# Altium footprint library CDPcomponents.PcbLib: 40 footprints (part 1 of 3)
Each footprint in its own frame and in the unit in brackets; x right, y up, seen from the top. Pads: shape width x height; smd on the part's side, far side on the other; paste and mask are expansions set on the pad; w line width, h text height; cw(c..) or ccw(c..) is an arc to the next point about the centre after c.
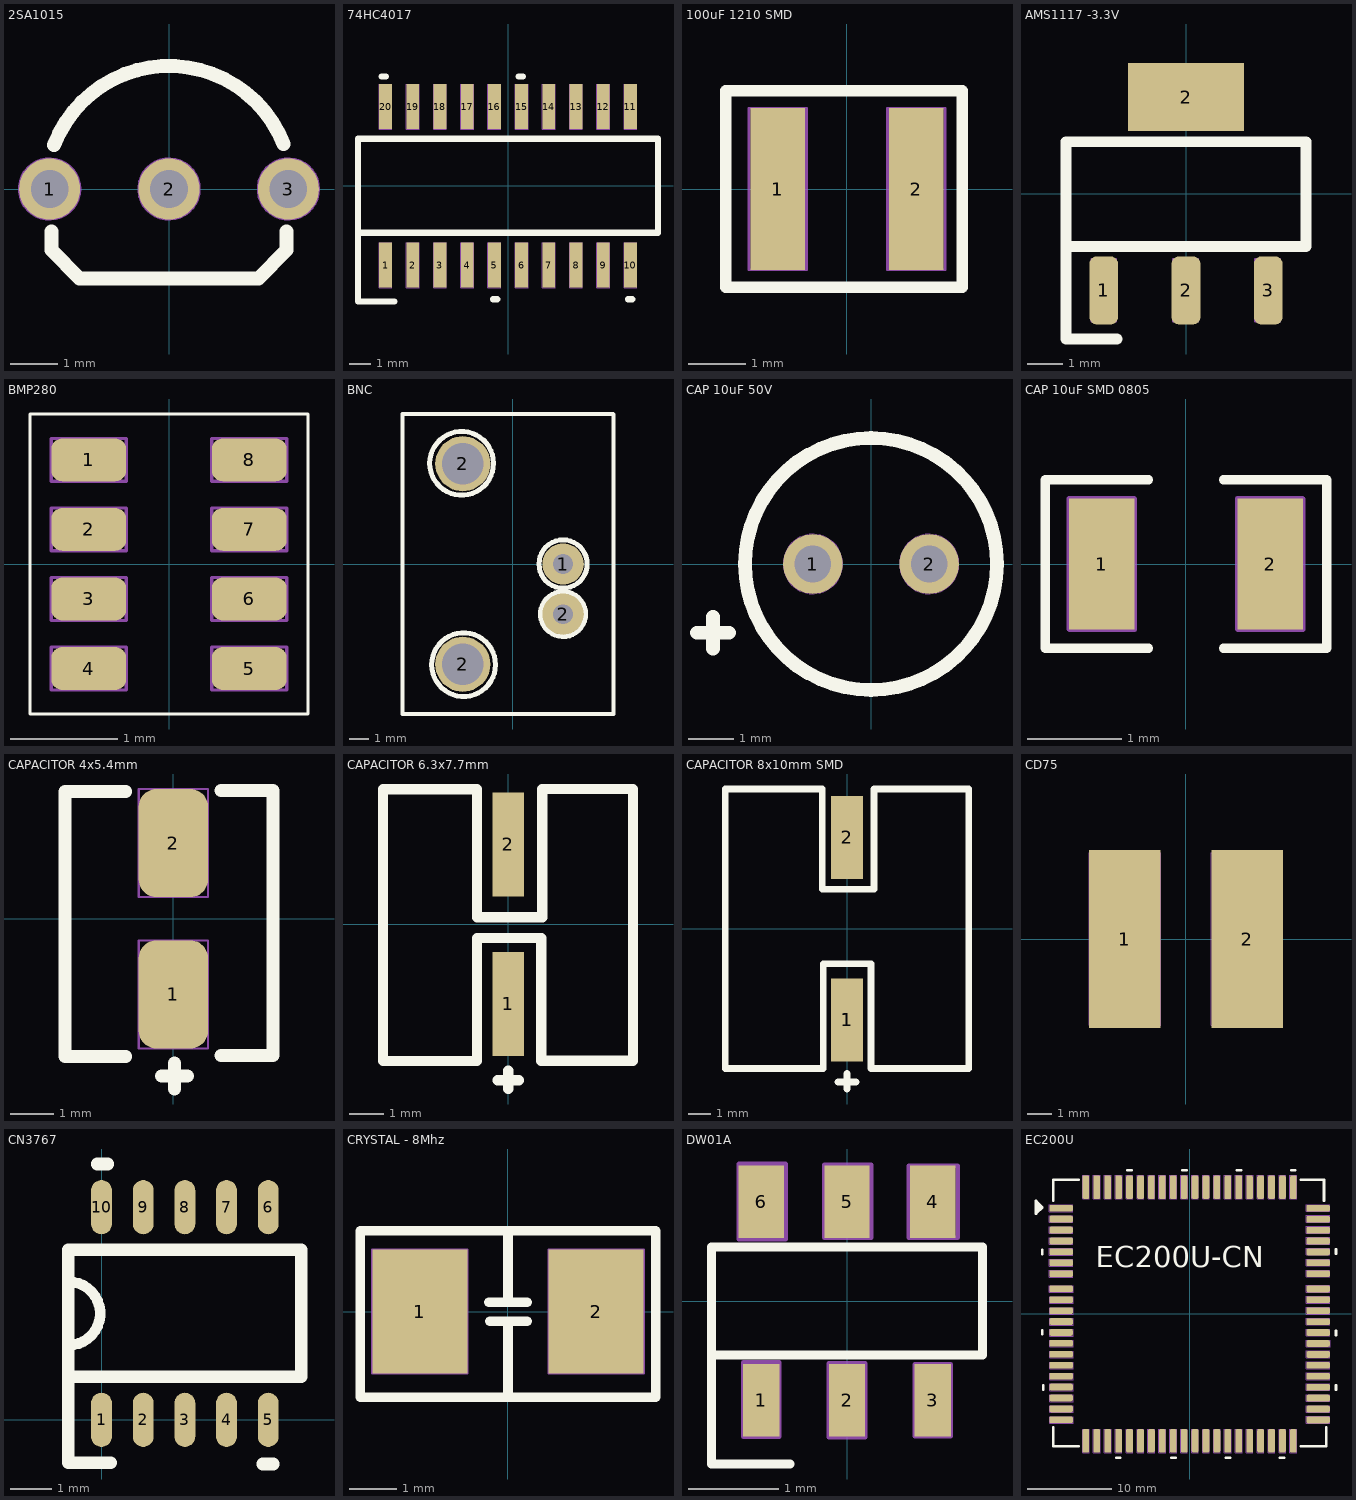
[diagram p0: the footprints below, top view; thin cyan lines are the x and y axes]

## 2SA1015 [mm] "2SA1015 (TO-92)"
height 4.8
pads (3):
  round 1.3 hole 0.8 mask+0.1: 1(-2.54,0) 2(0,0) 3(2.54,0)
Top Overlay:
  lines w0.3: -2.445,0.935 cw(c0,0) 2.437,0.954 ; 2.5,-0.9 2.5,-1.3 1.9,-1.9 -1.9,-1.9 -2.5,-1.3 -2.5,-0.9 ; -2.5,-0.9 -2.5,-0.9
Mechanical 1:
  circle w0.05: c-2.54,0 r0.65
  circle w0.05: c2.54,0 r0.65
  circle w0.05: c-2.54,0 r0.65
  circle w0.05: c0,0 r0.65
  lines w0.05: -2.5,-0.8 -2.5,-1.3 -1.9,-1.9 -1.275,-1.9 -0.025,-1.9 1.8,-1.9 2.5,-1.2 2.5,-0.8 ; -2.467,0.897 cw(c0,0) 2.48,0.859
3D body "User Library-TO-92_SS127.STEP": height 8.85, standoff -4.42, extent -4.227,-1.4 3.4,2.47

## 74HC4017 [mm] "74HC4017 (SO16-SOT109-1)"
height 1.45
pads (20):
  rect 0.6x2.1 smd mask+0.1: 1(-5.715,-3.7) 2(-4.445,-3.7) 3(-3.175,-3.7) 4(-1.905,-3.7) 5(-0.635,-3.7) 6(0.635,-3.7) 7(1.905,-3.7) 8(3.175,-3.7) 9(4.445,-3.7) 10(5.715,-3.7) 11(5.715,3.7) 12(4.445,3.7) 13(3.175,3.7) 14(1.905,3.7) 15(0.635,3.7) 16(-0.635,3.7) 17(-1.905,3.7) 18(-3.175,3.7) 19(-4.445,3.7) 20(-5.715,3.7)
Top Overlay:
  lines w0.3: -5.9,5.1 -5.7,5.1 ; -5.3,-5.4 -7,-5.4 -7,-2.2 ; -0.7,-5.3 -0.5,-5.3 ; 0.5,5.1 0.7,5.1 ; 5.6,-5.3 5.8,-5.3 ; -7,-2.2 7,-2.2 7,2.2 -0.45,2.2 -7,2.2 -7,-2.2
Mechanical 1:
  lines w0.05: -7,-2.2 7,-2.2 7,2.2 0.45,2.2 -7,2.2 -7,-1.665 -7,-2.2 ; -6.015,-4.75 -5.415,-4.75 -5.415,-2.65 -6.015,-2.65 -6.015,-4.75 ; -6.015,2.65 -6.015,4.75 -5.415,4.75 -5.415,2.65 -6.015,2.65 ; -4.745,-4.75 -4.745,-2.65 -4.145,-2.65 -4.145,-4.75 -4.745,-4.75 ; -4.745,2.65 -4.745,4.75 -4.145,4.75 -4.145,2.65 -4.745,2.65 ; -3.475,-4.75 -3.475,-2.65 -2.875,-2.65 -2.875,-4.75 -3.475,-4.75 ; -3.475,2.65 -3.475,4.75 -2.875,4.75 -2.875,2.65 -3.475,2.65 ; -2.205,-4.75 -2.205,-2.65 -1.605,-2.65 -1.605,-4.75 -2.205,-4.75 ; -2.205,2.65 -2.205,4.75 -1.605,4.75 -1.605,2.65 -2.205,2.65 ; -0.935,-4.75 -0.935,-2.65 -0.335,-2.65 -0.335,-4.75 -0.935,-4.75 ; -0.935,2.65 -0.935,4.75 -0.335,4.75 -0.335,2.65 -0.935,2.65 ; 0.335,-4.75 0.335,-2.65 0.935,-2.65 0.935,-4.75 0.335,-4.75 ; 0.335,2.65 0.335,4.75 0.935,4.75 0.935,2.65 0.335,2.65 ; 1.605,-4.75 1.605,-2.65 2.205,-2.65 2.205,-4.75 1.605,-4.75 ; 1.605,2.65 1.605,4.75 2.205,4.75 2.205,2.65 1.605,2.65 ; 2.875,-4.75 2.875,-2.65 3.475,-2.65 3.475,-4.75 2.875,-4.75 ; 2.875,2.65 2.875,4.75 3.475,4.75 3.475,2.65 2.875,2.65 ; 4.145,-4.75 4.145,-2.65 4.745,-2.65 4.745,-4.75 4.145,-4.75 ; 4.145,2.65 4.145,4.75 4.745,4.75 4.745,2.65 4.145,2.65 ; 5.415,-4.75 5.415,-2.65 6.015,-2.65 6.015,-4.75 5.415,-4.75 ; 5.415,2.65 5.415,4.75 6.015,4.75 6.015,2.65 5.415,2.65

## 100uF 1210 SMD [mm]
pads (2):
  rect 0.95x2.8 smd: 1(-1.2,0) 2(1.2,0)
Top Overlay:
  lines w0.2: -2.1,-1.7 -2.1,1.7 -1.9,1.7 -0.1,1.7 2,1.7 2,1.2 2,0 2,-1.7 -2.1,-1.7
Mechanical 1:
  lines w0.05: -1.7,-1.4 -1.7,1.4 -0.7,1.4 -0.7,-1.4 -1.7,-1.4 ; 0.7,-1.4 1.7,-1.4 1.7,1.4 0.7,1.4 0.7,-1.4
3D body "GRM32EC80G107KE20L.stp": height 2.7, standoff 0, extent -1.6,-1.25 1.6,1.25

## AMS1117 -3.3V [mm]
pads (4):
  rrect50% 0.8x1.9 smd: 1(-2.3,-2.7) 2(0,-2.7) 3(2.3,-2.7)
  rect 3.25x1.9 smd: 2(0,2.7)
Top Overlay:
  lines w0.3: -3.355,-1.5 -3.355,-4.055 -3.353,-4.057 -1.929,-4.057 ; -3.355,-1.472 3.355,-1.472 3.355,1.452 -0.398,1.452 -3.355,1.452 -3.355,-1.472
Mechanical 1:
  lines w0.05: -2.475,-1.825 -1.95,-1.825 -1.95,-3.575 -2.65,-3.575 -2.65,-1.825 -2.3,-1.825 ; -0.185,-1.825 0.34,-1.825 0.34,-3.575 -0.36,-3.575 -0.36,-1.825 -0.01,-1.825 ; 0,3.542 1.4,3.542 1.4,1.832 -1.4,1.832 -1.4,3.543 0.35,3.543 ; 2.105,-1.825 2.63,-1.825 2.63,-3.575 1.93,-3.575 1.93,-1.825 2.28,-1.825
3D body "AMS1117-3.3.stp": height 1.8, standoff 0, extent -3.252,-3.5 3.253,3.5

## BMP280 [mm]
pads (8):
  rrect50% 0.7x0.4 smd: 1(-0.75,0.975) 2(-0.75,0.325) 3(-0.75,-0.325) 4(-0.75,-0.975) 5(0.75,-0.975) 6(0.75,-0.325) 7(0.75,0.325) 8(0.75,0.975)
Top Overlay:
  lines w0.03: -1.3,-1.4 1.3,-1.4 1.3,1.3 1.3,1.404 -1.3,1.404 -1.3,1.3 -1.3,-1.4
Mechanical 1:
  lines w0.03: 0.4,-1.175 0.4,-0.775 ; 0.4,-1.175 1.1,-1.175 ; 0.4,-1.175 0.4,-0.775 ; 0.4,-1.175 1.1,-1.175 ; 0.4,-0.775 1.1,-0.775 ; 0.4,-0.775 1.1,-0.775 ; 1.1,-1.175 1.1,-0.775 ; 1.1,-1.175 1.1,-0.775 ; -1.1,-1.175 -0.4,-1.175 -0.4,-0.775 -1.1,-0.775 -1.1,-1.175 ; -1.1,-0.525 -0.4,-0.525 -0.4,-0.125 -1.1,-0.125 -1.1,-0.525 ; -1.1,0.125 -0.4,0.125 -0.4,0.525 -1.1,0.525 -1.1,0.125 ; -1.1,0.775 -0.4,0.775 -0.4,1.175 -1.1,1.175 -1.1,0.775 ; 0.4,-0.525 0.4,-0.125 1.1,-0.125 1.1,-0.525 0.4,-0.525 ; 0.4,0.125 0.4,0.525 1.1,0.525 1.1,0.125 0.4,0.125 ; 0.4,0.775 0.4,1.175 1.1,1.175 1.1,0.775 0.4,0.775
3D body "bmp280.stp": height 1, standoff 0, extent -1,-1.25 1,1.25

## BNC [mm]
pads (4):
  round 2.1 hole 1: 1(2.54,0) 2(2.54,-2.54)
  round 2.8 hole 2.1: 2(-2.54,-5.08) 2(-2.54,5.08)
Top Overlay:
  circle w0.254: c-2.6,5.1 r1.616
  circle w0.254: c-2.5,-5.1 r1.616
  circle w0.254: c2.54,-2.54 r1.14
  circle w0.254: c2.54,0 r1.221
  lines w0.2: -5.6,-7.6 5.1,-7.6 5.1,7.571 5.071,7.6 4.5,7.6 -5.6,7.6 -5.6,-7.6
3D body "CP-BNCPC-010.stp": height 15.9, standoff -5, extent -30.625,-7.325 4.785,7.325

## CAP 10uF 50V [mm] "Aluminum 10uF 50V"
height 13
pads (2):
  round 1.3 hole 0.8 mask+0.1: 1(-1.27,0) 2(1.27,0)
Top Overlay:
  circle w0.3: c0,0 r2.75
  lines w0.3: -3.8,-1.5 -3.1,-1.5 ; -3.45,-1.85 -3.45,-1.15
Mechanical 1:
  circle w0.05: c0,0 r2.75
  circle w0.01: c-1.27,0 r0.65
  circle w0.01: c1.27,0 r0.65
3D body "User Library-Capacitor 10uF 50V 7x5mm.STEP": height 7.74, standoff -2.32, extent -2.6,-2.31 2.43,2.7

## CAP 10uF SMD 0805 [mm]
pads (2):
  rect 0.7x1.4 smd: 1(-0.9,0) 2(0.9,0)
Top Overlay:
  lines w0.1: -0.4,-0.9 -1.5,-0.9 -1.5,0.9 -0.4,0.9 ; 0.4,-0.9 1.5,-0.9 1.5,0.9 0.4,0.9
Mechanical 1:
  lines w0.05: -0.551,0.699 -0.552,0.7 ; 0.551,-0.699 0.552,-0.7 ; -0.552,0.7 -0.6,0.7 -1.247,0.7 -1.248,0.698 -1.248,-0.697 -1.243,-0.702 -0.55,-0.702 -0.547,-0.699 -0.547,0.695 -0.552,0.7 ; 0.552,-0.7 0.6,-0.7 1.247,-0.7 1.248,-0.698 1.248,0.697 1.243,0.702 0.55,0.702 0.547,0.699 0.547,-0.695 0.552,-0.7
3D body "0805Y0160561FFR.stp": height 1.3, standoff 0, extent -1,-0.625 1,0.625

## CAPACITOR 4x5.4mm [mm]
pads (2):
  rrect50% 1.6x2.5 smd: 1(0,-1.75) 2(0,1.75)
Top Overlay:
  lines w0.3: -1.1,-3.189 -2.5,-3.189 -2.5,2.945 -1.1,2.945 ; -0.273,-3.637 0.327,-3.637 ; 0.027,-3.937 0.027,-3.337 ; 1.1,-3.164 2.3,-3.164 2.3,2.968 1.1,2.968
Mechanical 1:
  lines w0.05: -0.8,-3 -0.8,-0.5 0.8,-0.5 0.8,-3 -0.8,-3 ; -0.8,0.5 0.8,0.5 0.8,3 -0.8,3 -0.8,0.5
3D body "EEEFP1E100AR.stp": height 5.8, standoff 0, extent -2.25,-2.5 2.05,2.5

## CAPACITOR 6.3x7.7mm [mm]
pads (2):
  rect 0.9x3 smd: 1(0,-2.3) 2(0,2.3)
Top Overlay:
  lines w0.3: -0.3,-4.5 0.3,-4.5 ; 0,-4.755 0,-4.233 ; 0,-4.5 0,-4.3 ; -3.612,-3.948 -0.9,-3.948 -0.9,-0.5 -0.9,-0.399 -0.899,-0.4 0.957,-0.4 0.957,-3.945 3.6,-3.945 3.6,3.9 0.978,3.9 0.978,0.2 -0.9,0.2 -0.9,3.898 -3.612,3.898 -3.612,-3.948
3D body "User Library-User Library-CAP_Al_SMD_6_3x7_7mm.STEP": height 7.7, standoff 0, extent -3.3,-3.65 3.3,3.65

## CAPACITOR 8x10mm SMD [mm]
pads (3):
  rect 1.4x3.7 smd: 1(0,-4.05) 1(0,-4.05) 2(0,4.05)
Top Overlay:
  lines w0.3: -0.4,-6.8 0.4,-6.8 ; 0,-7.113 0,-6.428 ; 0,-6.8 0,-6.6 ; -5.4,-6.2 -5.4,6.2 -1.1,6.2 -1.1,1.75 1.2,1.75 1.2,6.2 5.4,6.2 5.4,-6.2 1.071,-6.2 1.071,-1.55 -1.054,-1.55 -1.054,-2.402 -1.053,-2.403 -1.053,-6.2 -5.4,-6.2
3D body "EEE1EA331AP.stp": height 10.3, standoff 0.1, extent -5.15,-5.85 5.15,5.85

## CD75 [mm]
pads (2):
  rect 2.9x7.2 smd: 1(-2.475,0) 2(2.475,0)
Mechanical 1:
  lines w0.05: -3.925,-3.5 -3.925,3.5 -1.025,3.5 -1.025,-3.5 -3.925,-3.5 ; 1.025,-3.5 3.925,-3.5 3.925,3.5 1.025,3.5 1.025,-3.5
3D body "User Library-cd75.STEP": height 5.09, standoff 0, extent -3.834,-3.5 3.834,3.5

## CN3767 [mm]
pads (10):
  oval 0.5x1.3 smd: 1(0,0) 2(1,0) 3(2,0) 4(3,0) 5(4,0) 6(4,5.1) 7(3,5.1) 8(2,5.1) 9(1,5.1) 10(0,5.1)
Top Overlay:
  lines w0.254: -0.794,1.788 ccw(c-0.794,2.55) -0.794,3.312
  lines w0.3: -0.54,1.026 -0.794,1.026 ; -0.105,6.136 0.149,6.136 ; 0.222,-1.027 -0.794,-1.027 -0.794,1.026 ; 3.867,-1.061 4.121,-1.061 ; -0.794,1.026 4.794,1.026 4.794,4.074 -0.794,4.074 -0.794,1.026
3D body "CN3767.stp": height 1.75, standoff 0, extent -0.45,-0.45 4.45,5.55

## CRYSTAL - 8Mhz [mm]
pads (2):
  rect 2x2.6 smd: 1(-1.85,0) 2(1.85,0)
Top Overlay:
  lines w0.2: -0.4,0.2 0.4,0.2 ; -0.382,-0.199 0.003,-0.199 0,-0.2 ; 0,-1.8 0,-0.2 ; 0,0.3 0,1.6 ; 0.4,-0.2 0,-0.2 ; -3.1,-1.8 3.1,-1.8 3.1,1.7 -2.7,1.7 -3.1,1.7 -3.1,-1.8
Mechanical 1:
  lines w0.05: -2.85,-1.3 -0.85,-1.3 -0.85,1.3 -2.85,1.3 -2.85,-1.3 ; 0.85,-1.3 0.85,1.3 2.85,1.3 2.85,-1.3 0.85,-1.3
3D body "User Library-5032_2.STEP": height 1.2, standoff -0.01, extent -2.609,-1.626 2.391,1.574

## DW01A [mm]
pads (6):
  rect 0.4x0.8 smd: 1(-0.95,-1.1) 2(0,-1.1) 3(0.95,-1.1)
  rect 0.5x0.8 smd: 4(0.95,1.1) 5(0,1.1) 6(-0.95,1.1)
Top Overlay:
  lines w0.1: -0.629,-1.804 -1.498,-1.804 -1.5,-1.805 -1.5,-0.6 ; -1.5,-0.6 -1.5,0.6 -0.6,0.6 1.5,0.6 1.5,-0.6 -1.5,-0.6
Mechanical 1:
  lines w0.05: -1.2,0.686 -1.2,1.518 -0.68,1.518 -0.68,0.686 -1.2,0.686 ; -1.15,-1.501 -0.75,-1.501 -0.75,-0.678 -1.15,-0.678 -1.15,-1.501 ; -0.253,0.7 -0.253,1.51 0.269,1.51 0.269,0.7 -0.253,0.7 ; -0.2,-1.508 0.2,-1.508 0.2,-0.688 -0.2,-0.688 -0.2,-1.508 ; 0.684,0.7 1.225,0.7 1.225,1.5 0.684,1.5 0.684,0.7 ; 0.75,-1.498 0.75,-0.7 1.15,-0.7 1.15,-1.498 0.75,-1.498
3D body "DW01A-G.stp": height 1.35, standoff 0, extent -1.425,-1.4 1.425,1.4

## EC200U [mm] "EC200U - Quectel"
pads (80):
  rrect50% 2.8x0.8 smd: 1(-15.299,12.6) 2(-15.299,11.3) 3(-15.299,10) 4(-15.299,8.7) 5(-15.299,7.4) 6(-15.299,6.1) 7(-15.299,4.8) 8(-15.299,0.4) 9(-15.299,-0.9) 10(-15.299,-2.2) 11(-15.299,-3.5) 12(-15.299,-4.8) 13(-15.299,-6.1) 14(-15.299,-7.4) 15(-15.299,-8.7) 16(-15.299,-10) 17(-15.299,-11.3) 18(-15.299,-12.6) 37(15.299,-12.614) 38(15.299,-11.314) 39(15.299,-10.014) 40(15.299,-8.714) 41(15.299,-7.414) 42(15.299,-6.114) 43(15.299,-4.814) 44(15.299,-3.514) 45(15.299,-2.214) 46(15.299,-0.914) 47(15.299,0.386) 48(15.299,4.786) 49(15.299,6.086) 50(15.299,7.386) 51(15.299,8.686) 52(15.299,9.986) 53(15.299,11.286) 54(15.299,12.586) 141(-15.299,3) 142(-15.299,1.7) 144(15.299,2.986) 145(15.299,1.686)
  rrect50% 0.8x2.8 smd: 19(-9.749,-15.1) 20(-8.449,-15.1) 21(-7.149,-15.1) 22(-5.849,-15.1) 23(-4.549,-15.1) 24(-3.249,-15.1) 25(-1.949,-15.1) 26(-0.649,-15.1) 27(0.651,-15.1) 28(1.951,-15.1) 29(3.251,-15.1) 30(4.551,-15.1) 31(5.851,-15.1) 32(7.151,-15.1) 33(8.451,-15.1) 34(9.751,-15.1) 35(11.051,-15.1) 36(12.351,-15.1) 55(12.349,15.087) 56(11.049,15.087) 57(9.749,15.087) 58(8.449,15.087) 59(7.149,15.087) 60(5.849,15.087) 61(4.549,15.087) 62(3.249,15.087) 63(1.949,15.087) 64(0.649,15.087) 65(-0.651,15.087) 66(-1.951,15.087) 67(-3.251,15.087) 68(-4.551,15.087) 69(-5.851,15.087) 70(-7.151,15.087) 71(-8.451,15.087) 72(-9.753,15.088) 113(-11.053,15.088) 114(-12.349,15.1) 116(-12.349,-15.1) 117(-11.049,-15.1)
Top Overlay:
  lines w0.3: -18.288,12.192 -18.288,12.236 -18.274,12.236 -17.82,12.689 ; -18.288,12.7 -17.526,12.7 ; -18.034,12.827 -18.034,13.208 -17.526,12.7 ; -17.526,-2.421 -17.526,-1.913 ; -17.526,7.112 -17.526,7.62 ; -17.429,-8.992 -17.429,-8.484 ; -16.256,-13.462 -16.256,-15.748 -13.208,-15.748 ; -16.256,13.462 -16.256,16.002 -13.208,16.002 ; -8.749,-17.138 -8.241,-17.138 ; -7.396,17.135 -6.888,17.135 ; -2.186,-17.138 -1.678,-17.138 ; -0.864,17.135 -0.356,17.135 ; 4.312,-17.138 4.82,-17.138 ; 5.629,17.135 6.137,17.135 ; 10.749,-17.138 11.257,-17.138 ; 12.086,17.135 12.594,17.135 ; 13.208,-15.748 16.256,-15.748 16.256,-13.462 ; 13.208,16.002 16.002,16.002 16.002,13.462 ; 17.431,-8.998 17.431,-8.49 ; 17.431,-2.513 17.431,-2.005 ; 17.431,7.191 17.431,7.699 ; -17.526,12.7 -18.288,11.938 -18.288,13.462 -17.526,12.7
  text "EC200U-CN" at -11.184,5.58 h2.5
Mechanical 1:
  drawing of 580 lines, arcs and shapes, not listed
3D body "EC200U.stp": height 2.35, standoff -0.05, extent -15.649,-14.057 15.351,13.943